# Altium footprint library PIF_PCB_Lib.PcbLib: 108 footprints (part 6 of 7)
Each footprint in its own frame and in the unit in brackets; x right, y up, seen from the top. Pads: shape width x height; smd on the part's side, far side on the other; paste and mask are expansions set on the pad; w line width, h text height; cw(c..) or ccw(c..) is an arc to the next point about the centre after c.
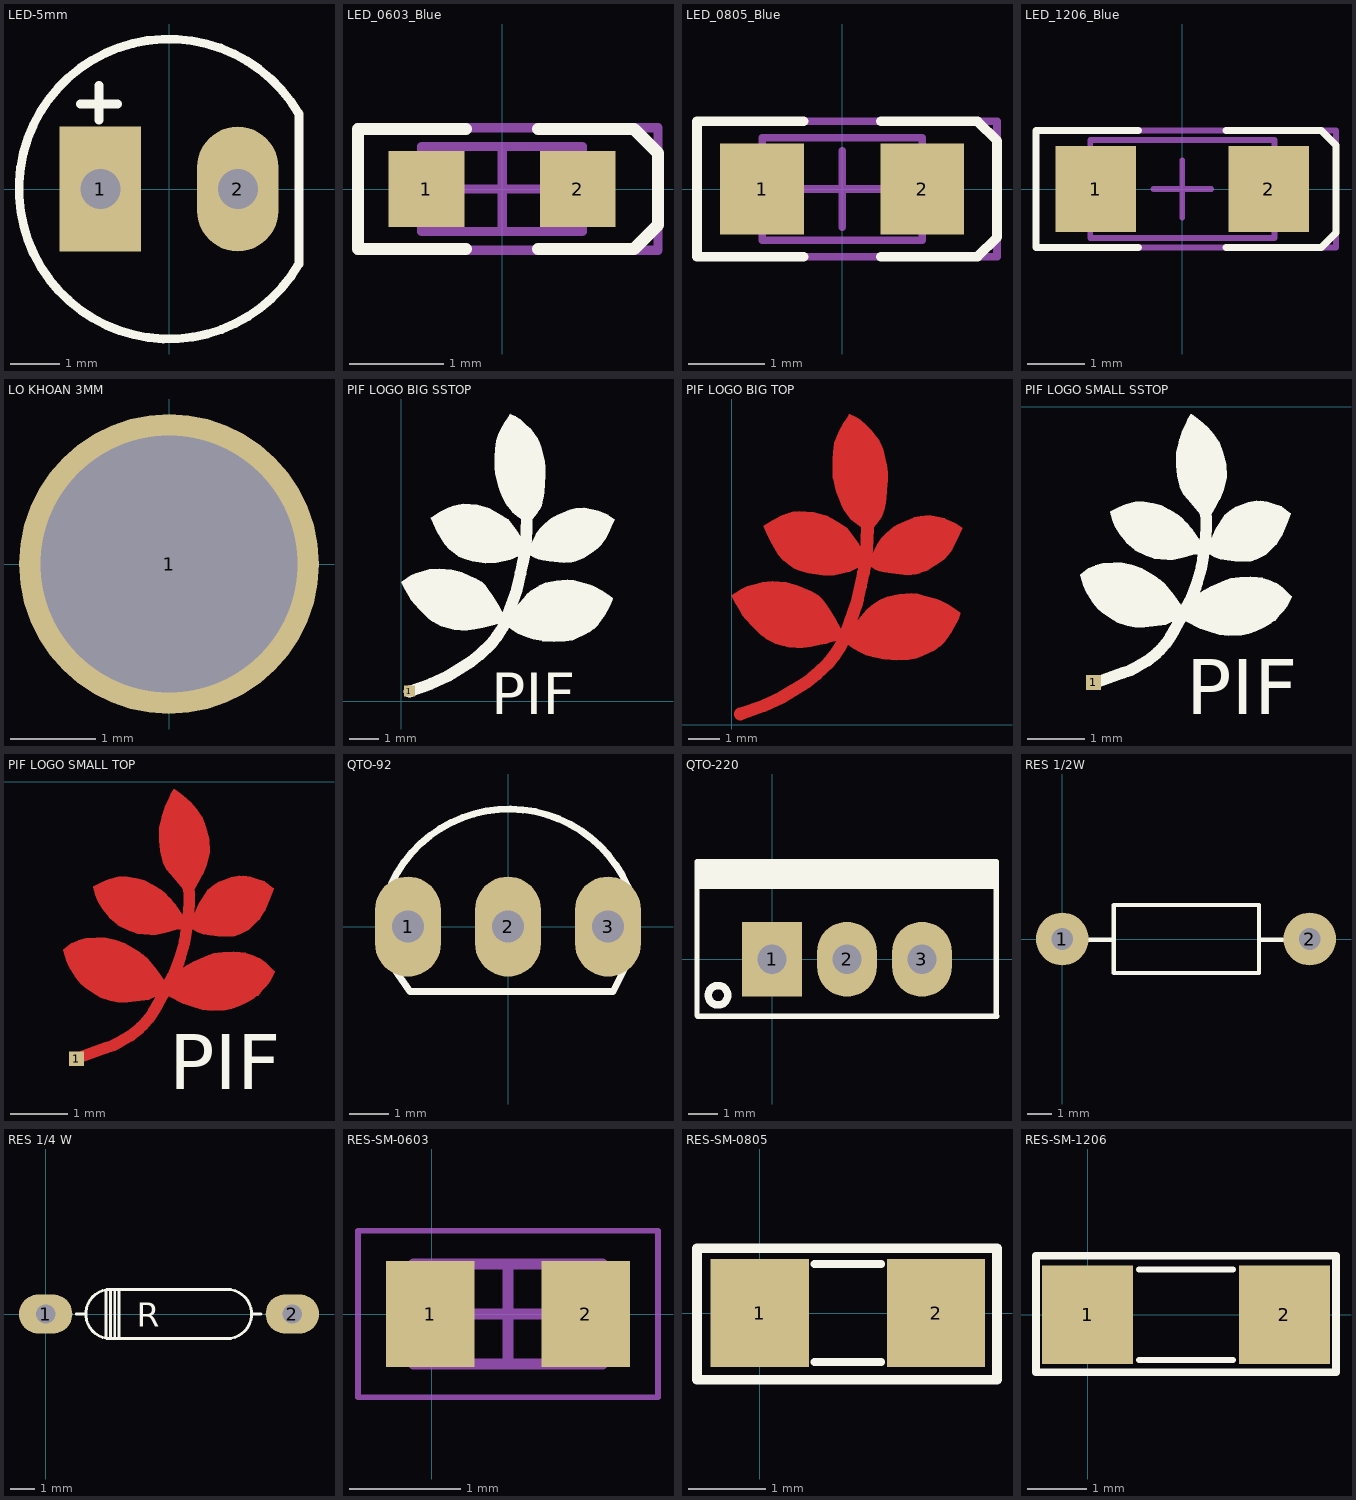
[diagram p5: the footprints below, top view; thin cyan lines are the x and y axes]

## LED-5mm [mil] "LED 2 PIN, 5 ly , Only colour, pin to pin 110mil"
height 300
pads (2):
  rect 65x100 hole 32: 1(-55,0)
  oval 65x100 hole 32: 2(55,0)
Top Overlay:
  lines w7: -71,68 -41,68 ; -56,55 -56,83 ; 103.51,60.71 ccw(c0,0) 103.94,-59.97 ; 104,-59 104,60
3D body "User Library-LEDd5B.STEP": height 339.18, standoff -243.49, extent -113.31,-120.49 100.08,116.5

## LED_0603_Blue [mm] "Chip LED, 2-Leads, Body 1.6x0.8mm, IPC Medium Density"
height 0.68
pads (2):
  rect 0.8x0.8 smd: 1(-0.8,0) 2(0.8,0)
Top Overlay:
  lines w0.127: -0.381,-0.635 -1.524,-0.635 -1.524,0.635 -0.381,0.635 ; 0.381,-0.635 1.397,-0.635 1.651,-0.381 1.651,0.381 1.397,0.635 0.381,0.635
Mechanical 13:
  lines w0.1: -0.85,-0.45 0.85,-0.45 0.85,0.45 -0.85,0.45 -0.85,-0.45
Mechanical 15:
  lines w0.1: -0.45,0 0.45,0 ; 0,-0.45 0,0.45 ; -1.525,-0.65 1.651,-0.65 1.651,0.65 -1.525,0.65 -1.525,-0.65
3D body "WL-SMCW_0603_LED.stp": height 0.7, standoff 0, extent -0.8,-0.4 0.8,0.4

## LED_0805_Blue [mm] "Chip LED, 2-Leads, Body 2.0x1.3mm, IPC Medium Density"
height 0.8
pads (2):
  rect 1.1x1.2 smd: 1(-1.05,0) 2(1.05,0)
Top Overlay:
  lines w0.127: -0.508,-0.889 -1.905,-0.889 -1.905,0.889 -0.508,0.889 ; 0.508,-0.889 1.778,-0.889 2.032,-0.635 2.032,0.635 1.778,0.889 0.508,0.889
Mechanical 13:
  lines w0.1: -1.05,-0.675 1.05,-0.675 1.05,0.675 -1.05,0.675 -1.05,-0.675
Mechanical 15:
  lines w0.1: -0.5,0 0.5,0 ; 0,-0.5 0,0.5 ; -1.905,-0.889 2.032,-0.889 2.032,0.889 -1.905,0.889 -1.905,-0.889
3D body "WL-SMCW_0805_LED.stp": height 0.68, standoff -0.02, extent -1,-0.625 1,0.625

## LED_1206_Blue [mm] "Chip LED, 2-Leads, Body 3.2x1.6mm, IPC Medium Density"
height 0.69
pads (2):
  rect 1.4x1.5 smd: 1(-1.5,0) 2(1.5,0)
Top Overlay:
  lines w0.127: -0.762,-1.016 -2.54,-1.016 -2.54,1.016 -0.762,1.016 ; 0.762,-1.016 2.413,-1.016 2.667,-0.762 2.667,0.762 2.413,1.016 0.762,1.016
Mechanical 13:
  lines w0.1: -1.6,-0.85 1.6,-0.85 1.6,0.85 -1.6,0.85 -1.6,-0.85
Mechanical 15:
  lines w0.1: -0.5,0 0.5,0 ; 0,-0.5 0,0.5 ; -2.54,-1.016 2.667,-1.016 2.667,1.016 -2.54,1.016 -2.54,-1.016
3D body "WL-SMCW_1206_LED.stp": height 0.68, standoff 0, extent -1.6,-0.8 1.6,0.8

## LO KHOAN 3MM [mil]
pads (1):
  round 138 hole 118.1: 1(0,0)

## PIF LOGO BIG SSTOP [mil]
pads (1):
  rect 15x15 smd: 1(11,14)
Top Overlay:
  drawing of 22 lines, arcs and shapes, not listed
  text "PIF" at 121.67,-17 h56.25

## PIF LOGO BIG TOP [mil]
Top Layer:
  region: 225.34,164.82 225.4,164.84 233.33,164 233.38,163.98 233.44,163.98 240.93,161.92 255.92,158.15 255.96,158.13 256.01,158.13 261.01,156.06 261.03,156.04 261.06,156.03 272.3,150.2 272.32,150.17 272.36,150.17 282.36,143.5 282.37,143.47 282.4,143.47 286.57,140.13 286.64,140 286.75,139.89 286.75,139.79 286.8,139.7 286.76,139.56 286.76,139.4 283.86,131.9 283.84,131.87 283.83,131.84 279.23,123.07 279.23,123.06 275.9,116.83 275.87,116.81 275.86,116.77 267.12,104.27 267.08,104.23 267.05,104.18 261.22,98.35 261.16,98.32 261.13,98.27 254.46,93.67 254.42,93.66 254.39,93.63 247.72,90.29 247.71,90.29 238.11,85.72 238.09,85.72 238.09,85.71 232.25,83.21 232.17,83.21 232.11,83.17 222.11,81.5 222.06,81.51 222.02,81.49 207.02,81.06 206.99,81.07 206.97,81.06 191.13,81.89 191.09,81.92 191.04,81.91 178.97,84.41 178.95,84.42 178.92,84.42 168.92,87.35 168.88,87.38 168.83,87.38 158.83,91.95 158.81,91.98 158.77,91.99 151.27,96.59 151.24,96.62 151.21,96.63 145.78,100.79 145.75,100.83 145.71,100.85 145.68,100.94 145.6,101.01 145.59,101.12 145.53,101.22 145.54,101.26 145.53,101.3 145.56,101.39 145.56,101.49 153.49,126.49 153.63,126.66 153.74,126.83 156.17,128.45 165.28,139.21 169.44,144.21 169.49,144.24 169.51,144.28 175.75,149.68 175.79,149.7 175.82,149.74 186.26,156.41 186.3,156.41 186.32,156.44 195.06,160.61 195.14,160.62 195.21,160.66 210.21,163.6 210.25,163.59 210.28,163.6 225.28,164.84
  region: 247.66,262.28 247.74,262.3 257.74,260.63 257.76,260.62 257.78,260.62 266.94,258.52 266.99,258.49 267.06,258.49 273.72,255.59 280.39,252.65 280.44,252.61 280.5,252.59 288.83,246.76 288.94,246.59 289.07,246.44 289.07,246.39 289.1,246.34 289.05,246.15 289.04,245.95 287.38,242.64 284.89,236.43 284.88,236.41 284.87,236.38 281.14,228.88 276.54,219.71 276.49,219.67 276.47,219.6 271.47,213.33 271.46,213.33 271.45,213.32 266.45,207.48 266.39,207.45 266.35,207.38 258.45,201.55 258.43,201.55 258.41,201.53 246.75,194.03 246.68,194.02 246.62,193.97 236.62,190.23 236.6,190.23 236.59,190.22 231.15,188.55 231.08,188.56 231.02,188.53 220.62,187.69 220.56,187.71 220.5,187.7 200.9,189.76 200.89,189.77 200.87,189.77 192.14,191.03 192.11,191.05 192.07,191.05 185.8,192.71 185.79,192.73 185.76,192.73 180.76,194.39 180.71,194.44 180.64,194.45 173.57,198.62 173.52,198.68 173.45,198.71 173.43,198.76 173.38,198.79 173.35,198.91 173.28,199.01 173.29,199.09 173.26,199.17 173.28,199.22 173.27,199.27 175.33,212.17 175.39,212.26 175.4,212.36 182.5,226.13 182.53,226.15 182.53,226.19 187.53,233.69 187.59,233.73 187.61,233.79 194.61,240.79 194.65,240.8 194.66,240.83 203.5,248 203.53,248.01 203.54,248.03 204.53,248.7 204.54,248.7 204.55,248.71 206.58,249.95 206.6,249.95 206.61,249.97 208.7,251.11 208.71,251.11 208.72,251.12 210.86,252.17 210.88,252.17 210.89,252.18 211.97,252.65 219.03,255.98 219.04,255.98 219.06,255.99 228.22,259.76 228.28,259.76 228.34,259.79 236.27,261.46 236.31,261.45 236.35,261.47 247.59,262.31
  region: 51.34,179.76 51.38,179.77 68.45,178.51 68.51,178.48 68.57,178.48 81.91,174.75 81.94,174.72 81.98,174.72 99.91,167.22 99.94,167.19 99.98,167.19 108.72,162.19 108.76,162.13 108.83,162.1 113.83,157.5 113.86,157.44 113.92,157.41 118.09,151.57 118.09,151.56 118.1,151.56 123.1,144.06 123.1,144.05 131.44,131.15 131.44,131.11 131.47,131.09 133.97,126.09 136.91,120.25 136.92,120.1 136.97,119.97 136.97,118.3 136.93,118.19 136.93,118.06 132.03,105.73 131.99,105.69 131.98,105.63 131.92,105.59 131.89,105.51 131.77,105.47 131.69,105.38 131.63,105.38 131.58,105.34 124,103.52 118.59,101.85 118.56,101.86 118.53,101.84 110.63,100.17 110.62,100.17 99.79,98.07 99.78,98.07 90.18,96.4 90.12,96.42 90.07,96.39 80.9,96.39 80.87,96.4 80.84,96.4 71.68,97.23 71.63,97.25 71.59,97.24 64.52,98.91 64.5,98.92 64.49,98.92 54.49,101.85 54.43,101.9 54.36,101.91 43.09,108.14 43.08,108.16 43.05,108.16 37.22,111.93 37.18,111.99 37.11,112.02 25.44,124.09 25.43,124.09 18.37,131.59 18.36,131.61 18.34,131.62 13.74,137.05 13.72,137.12 13.67,137.16 10.34,143.39 3.68,155.05 3.68,155.06 3.67,155.07 0.33,161.33 0.31,161.54 0.27,161.75 0.29,161.78 0.29,161.82 0.42,161.99 0.54,162.16 12.21,170.06 12.27,170.08 12.31,170.12 19.81,173.45 19.85,173.45 19.88,173.48 29.48,176.41 29.49,176.41 29.49,176.42 38.22,178.92 38.29,178.91 38.36,178.94 51.29,179.77
  region: 147.8,389.42 148.04,389.41 155.11,386.08 155.14,386.05 155.18,386.04 161.01,382.27 161.04,382.23 161.09,382.21 169.03,375.14 169.04,375.13 175.27,369.3 175.29,369.25 175.34,369.22 181.61,360.88 181.62,360.88 184.95,356.28 184.97,356.21 185.02,356.16 187.92,349.49 187.92,349.48 190.02,344.48 190.02,344.42 190.06,344.37 192.56,333.14 192.56,333.13 194.23,325.2 194.22,325.18 194.23,325.16 195.47,316.42 195.46,316.38 195.47,316.33 195.47,307.17 195.47,307.15 195.47,307.13 194.64,294.19 194.64,294.18 193.81,283.35 193.79,283.32 193.8,283.29 192.96,278.29 192.96,278.28 191.3,269.55 191.28,269.52 191.28,269.48 190.25,266.05 190.22,266.02 190.22,265.98 187.42,259.58 187.37,259.53 187.36,259.47 183.76,254.27 183.73,254.25 183.72,254.21 178.12,247.81 178.05,247.78 178.02,247.72 176.68,246.72 176.74,243.41 176.71,243.32 176.72,243.23 176.62,243.1 176.56,242.96 176.47,242.92 176.41,242.84 176.26,242.82 176.11,242.76 176.02,242.79 175.93,242.78 165.49,245.72 165.42,245.77 165.33,245.79 159.93,249.12 159.91,249.15 159.87,249.16 150.27,256.66 150.23,256.73 150.16,256.78 141.83,267.61 141.81,267.66 141.77,267.69 138.04,274.35 138.04,274.4 138,274.44 134.23,284.44 131.34,291.94 131.34,291.98 131.31,292.01 129.21,300.34 129.21,300.35 127.15,308.68 127.15,308.74 127.13,308.8 126.69,316.3 126.7,316.31 126.69,316.33 126.69,332.17 126.7,332.19 126.7,332.22 127.53,341.79 127.53,341.8 128.8,353.07 128.84,353.14 128.83,353.22 131.73,361.12 131.74,361.13 134.67,368.63 134.71,368.68 134.72,368.73 140.55,378.33 140.57,378.34 140.57,378.36 145.11,384.99 147.19,389.12 147.37,389.28 147.55,389.44 147.56,389.44 147.57,389.44
  region: 103.01,266.37 103.07,266.34 103.14,266.35 112.3,263.85 112.31,263.84 112.33,263.84 118.99,261.74 119.04,261.71 119.1,261.7 126.2,257.97 126.27,257.89 132.43,254.63 132.45,254.61 132.48,254.6 144.58,246.67 144.65,246.58 144.74,246.53 156.41,231.53 156.42,231.49 156.45,231.47 164.35,218.57 164.35,218.56 166.85,214.4 166.88,214.18 166.93,213.97 164.87,200.2 164.83,200.15 164.84,200.08 164.74,199.98 164.69,199.85 164.64,199.83 164.61,199.78 164.55,199.77 164.51,199.72 147.84,191.82 147.77,191.82 147.71,191.77 128.94,187.61 128.88,187.62 128.82,187.59 114.25,187.16 114.2,187.18 114.14,187.17 96.64,189.67 96.6,189.69 96.55,189.69 85.29,193.02 85.26,193.04 85.22,193.04 78.15,195.98 78.1,196.03 78.02,196.05 73.02,199.79 73.01,199.79 73,199.8 65.07,206.06 65.05,206.11 65,206.13 58.77,212.8 58.74,212.87 58.68,212.91 48.25,230.81 48.24,230.84 48.22,230.86 43.22,241.29 43.22,241.31 43.21,241.32 40.31,248.39 40.31,248.58 40.27,248.76 40.31,248.82 40.31,248.88 40.44,249.01 40.55,249.17 51.38,256.27 51.42,256.28 51.44,256.3 63.51,262.54 63.56,262.54 63.6,262.57 71.1,265.07 71.11,265.07 71.12,265.08 76.96,266.75 77.01,266.74 77.06,266.77 84.56,267.6 84.62,267.59 84.68,267.61
  lines w15.75: 11.17,13.57 40.2,23.9 62.5,34.07 95,54.07 106.67,63.63 122.07,78.23 129.17,87.4 137.07,99.07 144.17,116.13 156.67,151.57 157.9,156.97 161.67,173.63 165.4,190.73 167.67,200.73 168.5,211.17 169.33,221.57 169.77,230.73 171,264.83
  text "PIF" at 121.67,-17 h56.25

## PIF LOGO SMALL SSTOP [mil]
pads (1):
  rect 10x10 smd: 1(-190,-188)
Top Overlay:
  drawing of 50 lines, arcs and shapes, not listed
  text "PIF" at -126.57,-209.53 h37.5

## PIF LOGO SMALL TOP [mil]
pads (1):
  rect 10x10 smd: 1(-190,-189)
Top Layer:
  region: -170.52,-106.31 -170.47,-106.3 -163.83,-107.57 -163.79,-107.6 -163.74,-107.59 -157.07,-110.13 -157.04,-110.16 -156.99,-110.17 -151.3,-113.63 -147.84,-115.53 -147.82,-115.55 -147.79,-115.56 -144.62,-117.79 -144.6,-117.82 -144.57,-117.83 -141.41,-120.66 -141.39,-120.7 -141.35,-120.72 -135.32,-128.02 -135.31,-128.04 -135.29,-128.05 -129.59,-135.95 -129.57,-136.04 -129.51,-136.12 -129.52,-136.19 -129.49,-136.27 -129.51,-136.31 -129.5,-136.35 -129.55,-136.43 -129.56,-136.53 -132.97,-142.69 -132.67,-144.41 -132.7,-144.55 -132.69,-144.69 -132.74,-144.74 -132.76,-144.81 -132.88,-144.89 -132.97,-144.99 -140.57,-148.49 -140.66,-148.49 -140.73,-148.54 -155,-150.44 -155.03,-150.43 -155.07,-150.44 -161.7,-150.44 -161.75,-150.42 -161.8,-150.43 -166.87,-149.46 -166.9,-149.44 -166.94,-149.44 -173.28,-147.24 -173.32,-147.21 -173.37,-147.2 -177.8,-144.67 -177.82,-144.65 -177.84,-144.64 -184.18,-140.21 -184.19,-140.18 -184.23,-140.17 -187.09,-137.64 -187.11,-137.6 -187.15,-137.57 -189.99,-134.07 -189.99,-134.05 -190.02,-134.03 -192.55,-130.23 -192.55,-130.21 -192.57,-130.2 -195.1,-125.77 -195.11,-125.74 -195.12,-125.73 -197.02,-121.63 -197.03,-121.58 -197.05,-121.55 -198.95,-114.88 -198.94,-114.78 -198.97,-114.68 -198.92,-114.58 -198.91,-114.47 -198.82,-114.4 -198.77,-114.31 -193.71,-110.21 -193.63,-110.19 -193.57,-110.13 -188.83,-108.23 -188.81,-108.23 -188.8,-108.22 -183.73,-106.62 -183.65,-106.62 -183.57,-106.59 -183.24,-106.59 -176.62,-106.29 -176.61,-106.3 -176.6,-106.29 -170.57,-106.29
  region: -155.42,-64.71 -155.38,-64.7 -149.38,-65.67 -149.35,-65.68 -149.32,-65.68 -143.92,-67.25 -143.88,-67.28 -143.82,-67.28 -138.12,-70.15 -138.1,-70.17 -138.08,-70.18 -131.98,-74.08 -131.96,-74.1 -131.94,-74.1 -129.07,-76.3 -129.04,-76.36 -128.98,-76.4 -127.74,-77.95 -125.89,-79.48 -125.85,-79.55 -125.79,-79.59 -124.24,-81.8 -122.36,-83.98 -122.34,-84.02 -122.31,-84.04 -120.72,-86.57 -118.52,-89.72 -118.52,-89.74 -118.5,-89.75 -116.6,-92.92 -116.58,-93.07 -116.53,-93.2 -116.54,-93.23 -116.53,-93.26 -117.16,-98.96 -117.18,-98.99 -117.17,-99.02 -117.28,-99.17 -117.36,-99.32 -117.4,-99.33 -117.42,-99.36 -118.98,-100.33 -119.1,-100.35 -119.19,-100.4 -121.39,-100.7 -126.71,-102.29 -126.73,-102.28 -126.75,-102.29 -130.88,-103.23 -130.89,-103.23 -135.62,-104.2 -135.68,-104.19 -135.73,-104.21 -139.53,-104.21 -139.55,-104.2 -139.58,-104.21 -148.88,-103.47 -148.95,-103.44 -149.02,-103.44 -154.09,-101.54 -154.11,-101.52 -154.14,-101.52 -161.74,-97.72 -161.79,-97.66 -161.86,-97.64 -167.56,-92.57 -167.58,-92.52 -167.63,-92.5 -172.06,-86.8 -172.07,-86.77 -172.09,-86.76 -174.92,-82.32 -174.93,-82.28 -174.97,-82.24 -177.2,-76.84 -177.2,-76.8 -177.22,-76.77 -178.49,-72.04 -178.47,-71.89 -178.48,-71.73 -178.44,-71.69 -178.44,-71.63 -178.37,-71.58 -178.38,-71.49 -178.36,-71.47 -178.36,-71.45 -178.23,-71.32 -178.11,-71.18 -174.94,-69.61 -172.81,-68.55 -172.8,-68.55 -172.79,-68.54 -168.06,-66.34 -168.01,-66.34 -167.97,-66.31 -161.63,-64.71 -161.56,-64.72 -161.5,-64.69 -155.47,-64.69
  region: -123.07,-4.91 -122.89,-4.93 -122.87,-4.96 -122.84,-4.97 -118.74,-8.14 -118.72,-8.16 -118.7,-8.17 -115.22,-11.32 -112.06,-13.84 -112.04,-13.89 -111.99,-13.91 -107.89,-18.65 -107.88,-18.68 -107.85,-18.69 -104.35,-23.76 -104.34,-23.83 -104.29,-23.87 -101.76,-30.54 -101.76,-30.57 -101.74,-30.6 -99.54,-39.13 -99.55,-39.19 -99.53,-39.25 -99.19,-47.81 -99.22,-47.88 -99.2,-47.95 -101.11,-56.48 -101.14,-56.53 -101.14,-56.58 -104,-63.25 -104.02,-63.26 -104.02,-63.29 -107.19,-69.29 -107.2,-69.3 -107.2,-69.31 -110.03,-74.08 -110.08,-74.11 -110.1,-74.16 -112.97,-77.33 -112.98,-77.34 -112.98,-77.35 -113.01,-77.36 -113.02,-77.38 -113.18,-77.43 -113.34,-77.51 -113.35,-77.5 -113.37,-77.51 -113.39,-77.5 -113.41,-77.51 -113.57,-77.43 -113.73,-77.37 -113.74,-77.35 -113.75,-77.35 -113.76,-77.33 -113.78,-77.31 -125.48,-63.38 -128.65,-59.58 -128.67,-59.51 -128.73,-59.45 -130.96,-54.38 -130.96,-54.34 -130.99,-54.3 -132.89,-47 -132.88,-46.96 -132.91,-46.92 -133.54,-40.28 -133.53,-40.26 -133.54,-40.23 -133.54,-31 -133.51,-30.94 -133.52,-30.87 -131.29,-22.03 -131.28,-22.02 -131.28,-22 -129.38,-16.3 -129.35,-16.27 -129.35,-16.23 -127.16,-11.8 -125.89,-8.98 -125.87,-8.96 -125.87,-8.93 -123.63,-5.13 -123.6,-5.1 -123.59,-5.07 -123.44,-4.98 -123.3,-4.88 -123.27,-4.88 -123.24,-4.86
  region: -82.86,-115.8 -82.83,-115.79 -78.4,-116.09 -78.37,-116.11 -78.34,-116.1 -74.54,-116.73 -74.51,-116.76 -74.46,-116.75 -70.66,-118.02 -70.64,-118.04 -70.62,-118.04 -68.39,-119 -65.23,-120.26 -65.18,-120.32 -65.1,-120.34 -61,-123.5 -60.99,-123.53 -60.96,-123.54 -54.93,-129.24 -54.88,-129.35 -54.79,-129.45 -54.8,-129.54 -54.76,-129.62 -54.8,-129.73 -54.81,-129.86 -56.41,-133.33 -56.42,-133.34 -56.43,-133.36 -57.99,-136.23 -58.03,-136.26 -58.04,-136.3 -60.58,-139.47 -60.59,-139.48 -60.6,-139.49 -63.12,-142.32 -65.98,-145.81 -66.14,-145.9 -66.3,-146 -67.3,-146.19 -68.55,-147.42 -68.62,-147.45 -68.66,-147.5 -74.02,-150.67 -74.06,-150.67 -74.08,-150.7 -79.15,-152.93 -79.16,-152.93 -79.17,-152.94 -83.93,-154.84 -83.99,-154.84 -84.03,-154.86 -88.76,-155.8 -88.81,-155.79 -88.85,-155.81 -97.71,-156.14 -97.75,-156.13 -97.79,-156.14 -104.12,-155.51 -104.17,-155.48 -104.22,-155.49 -110.56,-153.59 -110.57,-153.58 -110.58,-153.58 -116.91,-151.34 -116.94,-151.32 -116.98,-151.32 -127.11,-146.25 -127.17,-146.18 -127.25,-146.15 -127.29,-146.05 -127.37,-145.97 -127.37,-145.95 -127.38,-145.94 -127.37,-145.85 -127.41,-145.77 -127.37,-145.67 -127.37,-145.56 -123.57,-136.39 -123.49,-136.32 -123.45,-136.22 -120.81,-133.55 -121.07,-131.92 -121.06,-131.9 -121.07,-131.88 -121.02,-131.7 -120.97,-131.51 -120.95,-131.51 -120.95,-131.49 -118.98,-129.13 -119,-129.14 -119.19,-129.16 -119.38,-129.2 -119.39,-129.19 -119.41,-129.19 -119.56,-129.07 -119.72,-128.96 -119.72,-128.94 -119.74,-128.94 -119.76,-128.74 -119.8,-128.55 -119.79,-128.54 -119.79,-128.52 -119.67,-128.37 -119.56,-128.21 -114.19,-124.75 -114.02,-124.71 -113.85,-124.66 -113.82,-124.68 -113.79,-124.67 -113.64,-124.77 -113.63,-124.78 -110.38,-122.84 -110.35,-122.83 -110.33,-122.81 -105.56,-120.58 -105.55,-120.58 -105.54,-120.57 -100.17,-118.37 -100.15,-118.37 -100.14,-118.35 -96.34,-117.09 -96.29,-117.09 -96.25,-117.07 -90.22,-116.1 -90.19,-116.11 -90.16,-116.09 -82.89,-115.79
  region: -82.86,-115.8 -82.83,-115.79 -78.4,-116.09 -78.37,-116.11 -78.34,-116.1 -74.54,-116.73 -74.51,-116.76 -74.46,-116.75 -70.66,-118.02 -70.64,-118.04 -70.62,-118.04 -68.39,-119 -65.23,-120.26 -65.18,-120.32 -65.1,-120.34 -61,-123.5 -60.99,-123.53 -60.96,-123.54 -54.93,-129.24 -54.88,-129.35 -54.79,-129.45 -54.8,-129.54 -54.76,-129.62 -54.8,-129.73 -54.81,-129.86 -56.41,-133.33 -56.42,-133.34 -56.43,-133.36 -57.99,-136.23 -58.03,-136.26 -58.04,-136.3 -60.58,-139.47 -60.59,-139.48 -60.6,-139.49 -63.12,-142.32 -65.98,-145.81 -66.14,-145.9 -66.3,-146 -67.3,-146.19 -68.55,-147.42 -68.62,-147.45 -68.66,-147.5 -74.02,-150.67 -74.06,-150.67 -74.08,-150.7 -79.15,-152.93 -79.16,-152.93 -79.17,-152.94 -83.93,-154.84 -83.99,-154.84 -84.03,-154.86 -88.76,-155.8 -88.81,-155.79 -88.85,-155.81 -97.71,-156.14 -97.75,-156.13 -97.79,-156.14 -104.12,-155.51 -104.17,-155.48 -104.22,-155.49 -110.56,-153.59 -110.57,-153.58 -110.58,-153.58 -116.91,-151.34 -116.94,-151.32 -116.98,-151.32 -127.11,-146.25 -127.17,-146.18 -127.25,-146.15 -127.29,-146.05 -127.37,-145.97 -127.37,-145.95 -127.38,-145.94 -127.37,-145.85 -127.41,-145.77 -127.37,-145.67 -127.37,-145.56 -123.57,-136.39 -123.49,-136.32 -123.45,-136.22 -120.81,-133.55 -121.07,-131.92 -121.06,-131.9 -121.07,-131.88 -121.02,-131.7 -120.97,-131.51 -120.95,-131.51 -120.95,-131.49 -118.98,-129.13 -119,-129.14 -119.19,-129.16 -119.38,-129.2 -119.39,-129.19 -119.41,-129.19 -119.56,-129.07 -119.72,-128.96 -119.72,-128.94 -119.74,-128.94 -119.76,-128.74 -119.8,-128.55 -119.79,-128.54 -119.79,-128.52 -119.67,-128.37 -119.56,-128.21 -114.19,-124.75 -114.02,-124.71 -113.85,-124.66 -113.82,-124.68 -113.79,-124.67 -113.64,-124.77 -113.63,-124.78 -110.38,-122.84 -110.35,-122.83 -110.33,-122.81 -105.56,-120.58 -105.55,-120.58 -105.54,-120.57 -100.17,-118.37 -100.15,-118.37 -100.14,-118.35 -96.34,-117.09 -96.29,-117.09 -96.25,-117.07 -90.22,-116.1 -90.19,-116.11 -90.16,-116.09 -82.89,-115.79
  region: -170.52,-106.31 -170.47,-106.3 -163.83,-107.57 -163.79,-107.6 -163.74,-107.59 -157.07,-110.13 -157.04,-110.16 -156.99,-110.17 -151.3,-113.63 -147.84,-115.53 -147.82,-115.55 -147.79,-115.56 -144.62,-117.79 -144.6,-117.82 -144.57,-117.83 -141.41,-120.66 -141.39,-120.7 -141.35,-120.72 -135.32,-128.02 -135.31,-128.04 -135.29,-128.05 -129.59,-135.95 -129.57,-136.04 -129.51,-136.12 -129.52,-136.19 -129.49,-136.27 -129.51,-136.31 -129.5,-136.35 -129.55,-136.43 -129.56,-136.53 -132.97,-142.69 -132.67,-144.41 -132.7,-144.55 -132.69,-144.69 -132.74,-144.74 -132.76,-144.81 -132.88,-144.89 -132.97,-144.99 -140.57,-148.49 -140.66,-148.49 -140.73,-148.54 -155,-150.44 -155.03,-150.43 -155.07,-150.44 -161.7,-150.44 -161.75,-150.42 -161.8,-150.43 -166.87,-149.46 -166.9,-149.44 -166.94,-149.44 -173.28,-147.24 -173.32,-147.21 -173.37,-147.2 -177.8,-144.67 -177.82,-144.65 -177.84,-144.64 -184.18,-140.21 -184.19,-140.18 -184.23,-140.17 -187.09,-137.64 -187.11,-137.6 -187.15,-137.57 -189.99,-134.07 -189.99,-134.05 -190.02,-134.03 -192.55,-130.23 -192.55,-130.21 -192.57,-130.2 -195.1,-125.77 -195.11,-125.74 -195.12,-125.73 -197.02,-121.63 -197.03,-121.58 -197.05,-121.55 -198.95,-114.88 -198.94,-114.78 -198.97,-114.68 -198.92,-114.58 -198.91,-114.47 -198.82,-114.4 -198.77,-114.31 -193.71,-110.21 -193.63,-110.19 -193.57,-110.13 -188.83,-108.23 -188.81,-108.23 -188.8,-108.22 -183.73,-106.62 -183.65,-106.62 -183.57,-106.59 -183.24,-106.59 -176.62,-106.29 -176.61,-106.3 -176.6,-106.29 -170.57,-106.29
  region: -155.42,-64.71 -155.38,-64.7 -149.38,-65.67 -149.35,-65.68 -149.32,-65.68 -143.92,-67.25 -143.88,-67.28 -143.82,-67.28 -138.12,-70.15 -138.1,-70.17 -138.08,-70.18 -131.98,-74.08 -131.96,-74.1 -131.94,-74.1 -129.07,-76.3 -129.04,-76.36 -128.98,-76.4 -127.74,-77.95 -125.89,-79.48 -125.85,-79.55 -125.79,-79.59 -124.24,-81.8 -122.36,-83.98 -122.34,-84.02 -122.31,-84.04 -120.72,-86.57 -118.52,-89.72 -118.52,-89.74 -118.5,-89.75 -116.6,-92.92 -116.58,-93.07 -116.53,-93.2 -116.54,-93.23 -116.53,-93.26 -117.16,-98.96 -117.18,-98.99 -117.17,-99.02 -117.28,-99.17 -117.36,-99.32 -117.4,-99.33 -117.42,-99.36 -118.98,-100.33 -119.1,-100.35 -119.19,-100.4 -121.39,-100.7 -126.71,-102.29 -126.73,-102.28 -126.75,-102.29 -130.88,-103.23 -130.89,-103.23 -135.62,-104.2 -135.68,-104.19 -135.73,-104.21 -139.53,-104.21 -139.55,-104.2 -139.58,-104.21 -148.88,-103.47 -148.95,-103.44 -149.02,-103.44 -154.09,-101.54 -154.11,-101.52 -154.14,-101.52 -161.74,-97.72 -161.79,-97.66 -161.86,-97.64 -167.56,-92.57 -167.58,-92.52 -167.63,-92.5 -172.06,-86.8 -172.07,-86.77 -172.09,-86.76 -174.92,-82.32 -174.93,-82.28 -174.97,-82.24 -177.2,-76.84 -177.2,-76.8 -177.22,-76.77 -178.49,-72.04 -178.47,-71.89 -178.48,-71.73 -178.44,-71.69 -178.44,-71.63 -178.37,-71.58 -178.38,-71.49 -178.36,-71.47 -178.36,-71.45 -178.23,-71.32 -178.11,-71.18 -174.94,-69.61 -172.81,-68.55 -172.8,-68.55 -172.79,-68.54 -168.06,-66.34 -168.01,-66.34 -167.97,-66.31 -161.63,-64.71 -161.56,-64.72 -161.5,-64.69 -155.47,-64.69
  region: -123.07,-4.91 -122.89,-4.93 -122.87,-4.96 -122.84,-4.97 -118.74,-8.14 -118.72,-8.16 -118.7,-8.17 -115.22,-11.32 -112.06,-13.84 -112.04,-13.89 -111.99,-13.91 -107.89,-18.65 -107.88,-18.68 -107.85,-18.69 -104.35,-23.76 -104.34,-23.83 -104.29,-23.87 -101.76,-30.54 -101.76,-30.57 -101.74,-30.6 -99.54,-39.13 -99.55,-39.19 -99.53,-39.25 -99.19,-47.81 -99.22,-47.88 -99.2,-47.95 -101.11,-56.48 -101.14,-56.53 -101.14,-56.58 -104,-63.25 -104.02,-63.26 -104.02,-63.29 -107.19,-69.29 -107.2,-69.3 -107.2,-69.31 -110.03,-74.08 -110.08,-74.11 -110.1,-74.16 -112.97,-77.33 -112.98,-77.34 -112.98,-77.35 -113.01,-77.36 -113.02,-77.38 -113.18,-77.43 -113.34,-77.51 -113.35,-77.5 -113.37,-77.51 -113.39,-77.5 -113.41,-77.51 -113.57,-77.43 -113.73,-77.37 -113.74,-77.35 -113.75,-77.35 -113.76,-77.33 -113.78,-77.31 -125.48,-63.38 -128.65,-59.58 -128.67,-59.51 -128.73,-59.45 -130.96,-54.38 -130.96,-54.34 -130.99,-54.3 -132.89,-47 -132.88,-46.96 -132.91,-46.92 -133.54,-40.28 -133.52,-40.23 -133.54,-40.18 -132.57,-29.42 -132.56,-29.4 -132.57,-29.37 -131.3,-22.07 -131.28,-22.04 -131.28,-22 -129.38,-16.3 -129.35,-16.27 -129.35,-16.23 -127.16,-11.8 -125.89,-8.98 -125.87,-8.96 -125.87,-8.93 -123.63,-5.13 -123.6,-5.1 -123.59,-5.07 -123.44,-4.98 -123.3,-4.88 -123.27,-4.88 -123.24,-4.86
  region: -76.29,-64.08 -76.23,-64.06 -71.49,-64.7 -71.45,-64.72 -71.4,-64.72 -66.34,-66.32 -66.33,-66.32 -61.56,-67.89 -61.49,-67.95 -61.4,-67.97 -55.7,-72.41 -55.64,-72.52 -55.55,-72.6 -55.54,-72.69 -55.5,-72.77 -55.53,-72.89 -55.52,-73.01 -57.42,-78.41 -57.44,-78.43 -57.44,-78.45 -60.94,-86.68 -60.96,-86.71 -60.97,-86.75 -62.87,-89.91 -62.87,-89.92 -65.41,-94.02 -65.46,-94.06 -65.49,-94.12 -72.46,-100.79 -72.53,-100.82 -72.58,-100.88 -78.58,-104.05 -78.63,-104.05 -78.66,-104.08 -82.46,-105.35 -82.55,-105.34 -82.63,-105.37 -93.4,-105.37 -93.43,-105.36 -93.46,-105.37 -98.86,-104.74 -98.87,-104.73 -98.88,-104.74 -103.31,-104.1 -103.37,-104.07 -103.44,-104.07 -107.24,-102.47 -107.26,-102.44 -107.29,-102.44 -110.76,-100.54 -110.81,-100.48 -110.88,-100.45 -110.93,-100.32 -111.02,-100.22 -111.01,-100.14 -111.04,-100.07 -111.04,-93.43 -111,-93.33 -111,-93.22 -106.56,-83.08 -106.53,-83.05 -106.52,-83.01 -100.82,-74.14 -100.75,-74.09 -100.71,-74.02 -97.24,-71.15 -97.21,-71.14 -97.19,-71.11 -92.76,-68.28 -92.7,-68.27 -92.66,-68.23 -84.43,-65.06 -84.37,-65.06 -84.33,-65.03 -78.93,-64.07 -78.75,-64.11 -78.56,-64.13 -78.55,-64.15 -78.52,-64.16 -78.44,-64.28 -76.36,-64.06
  region: -76.29,-64.08 -76.23,-64.06 -71.49,-64.7 -71.45,-64.72 -71.4,-64.72 -66.34,-66.32 -66.33,-66.32 -61.56,-67.89 -61.49,-67.95 -61.4,-67.97 -55.7,-72.41 -55.64,-72.52 -55.55,-72.6 -55.54,-72.69 -55.5,-72.77 -55.53,-72.89 -55.52,-73.01 -57.42,-78.41 -57.44,-78.43 -57.44,-78.45 -60.94,-86.68 -60.96,-86.71 -60.97,-86.75 -62.87,-89.91 -62.87,-89.92 -65.41,-94.02 -65.46,-94.06 -65.49,-94.12 -72.46,-100.79 -72.53,-100.82 -72.58,-100.88 -78.58,-104.05 -78.63,-104.05 -78.66,-104.08 -82.46,-105.35 -82.55,-105.34 -82.63,-105.37 -93.4,-105.37 -93.43,-105.36 -93.46,-105.37 -98.86,-104.74 -98.87,-104.73 -98.88,-104.74 -103.31,-104.1 -103.37,-104.07 -103.44,-104.07 -107.24,-102.47 -107.26,-102.44 -107.29,-102.44 -110.76,-100.54 -110.81,-100.48 -110.88,-100.45 -110.93,-100.32 -111.02,-100.22 -111.01,-100.14 -111.04,-100.07 -111.04,-93.43 -111,-93.33 -111,-93.22 -106.56,-83.08 -106.53,-83.05 -106.52,-83.01 -100.82,-74.14 -100.75,-74.09 -100.71,-74.02 -97.24,-71.15 -97.21,-71.14 -97.19,-71.11 -92.76,-68.28 -92.7,-68.27 -92.66,-68.23 -84.43,-65.06 -84.37,-65.06 -84.33,-65.03 -78.93,-64.07 -78.75,-64.11 -78.56,-64.13 -78.55,-64.15 -78.52,-64.16 -78.44,-64.28 -76.36,-64.06
  lines w7.87: -169.53,-181.33 -190.97,-189.03 -169.53,-181.33 ; -169.53,-181.33 -164.57,-179.7 ; -169.53,-181.33 -164.57,-179.7 ; -164.57,-179.7 -160.73,-177.5 ; -164.57,-179.7 -160.73,-177.5 ; -160.73,-177.5 -153.03,-173.1 ; -160.73,-177.5 -153.03,-173.1 ; -153.03,-173.1 -146.97,-168.13 ; -153.03,-173.1 -146.97,-168.13 ; -146.97,-168.13 -144.07,-165.43 ; -146.97,-168.13 -144.07,-165.43 ; -144.07,-165.43 -140.33,-161.17 ; -144.07,-165.43 -140.33,-161.17 ; -140.33,-161.17 -137.67,-157.17 ; -140.33,-161.17 -137.67,-157.17 ; -137.67,-157.17 -134.73,-152.1 ; -137.67,-157.17 -134.73,-152.1 ; -134.73,-152.1 -128.07,-139.57 ; -134.73,-152.1 -128.07,-139.57 ; -128.07,-139.57 -124.07,-132.1 ; -128.07,-139.57 -124.07,-132.1 ; -124.07,-132.1 -120.07,-122.5 ; -124.07,-132.1 -120.07,-122.5 ; -120.07,-122.5 -119.27,-119.83 ; -120.07,-122.5 -119.27,-119.83 ; -119.27,-119.83 -116.37,-109.67 ; -119.27,-119.83 -116.37,-109.67 ; -116.37,-109.67 -115.3,-104.07 ; -116.37,-109.67 -115.3,-104.07 ; -115.3,-104.07 -113.97,-94.73 ; -115.3,-104.07 -113.97,-94.73 ; -113.97,-94.73 -113.43,-88.33 ; -113.97,-94.73 -113.43,-88.33 ; -113.43,-88.33 -112.9,-82.47 ; -113.43,-88.33 -112.9,-82.47 ; -113.17,-75.53 -112.9,-82.47 ; -113.17,-75.53 -113.7,-72.07 -113.17,-75.53 ; -113.17,-75.53 -112.9,-82.47
Top Overlay:
  text "PIF" at -126.57,-209.53 h37.5

## QTO-92 [mil] "TO-92"
height 200
pads (3):
  oval 66x100 hole 32: 1(-100,0) 2(0,0) 3(100,0)
Top Overlay:
  lines w7: -116.52,43.21 cw(c0.97,-12.43) 119.94,39.97 ; -115.34,-40.24 -98,-65 105,-65 118,-39
3D body "SW3dPS-TO92.STEP": height 245.04, standoff -199.79, extent -108.87,-65.56 108.86,95

## QTO-220 [mil] "TO-220 - 1-2-3"
height 200
pads (3):
  rect 80x100 hole 39: 1(0,0)
  oval 80x100 hole 39: 2(100,0) 3(200,0)
Top Overlay:
  circle w10: c-72.03,-48 r12.97
  rectangle: -99,94 300,130
  lines w7: 298,107 299,93 ; -100,-75 -100,130 299,130 299,-75 300,-76 -76,-76 -99,-76 -100,-75
3D body "SW3dPS-TO220AB.STEP": height 754.72, standoff -400, extent -119,-64 322.46,120.65

## RES 1/2W [mil] "R 1/2W, 2 pin, 300mil"
height 100
pads (2):
  round 85 hole 35: 1(0,0) 2(400,0)
Top Overlay:
  lines w7: 42,-1 83,-1 ; 318,-1 356,-1 ; 83,-55 83,55 318,55 318,-55 83,-55
3D body "SW3dPS-AXIAL_RESISTOR(0.25W).STEP": height 91.42, standoff -70, extent -11.6,-45.49 413.6,49

## RES 1/4 W [mm]
pads (2):
  oval 2.2x1.6 hole 0.787: 1(0,0) 2(10.16,0)
Top Overlay:
  lines w0.12: 1.257,0 1.651,0 ; 2.489,-0.978 2.489,0.978 ; 2.591,1.016 7.468,1.016 cw(c7.468,0) 7.468,-1.016 2.667,-1.016 cw(c2.667,0) 2.667,1.016 ; 2.68,-1.016 2.667,-1.003 2.667,1.003 2.68,1.016 ; 2.845,-1.016 2.845,1.016 ; 3.023,-1.003 3.023,0.991 ; 8.484,0 8.877,0
  text "R" at 3.746,-0.521 h1
3D body "User Library-RESISTOR, 0_25 W, 0_4 IN LEAD PITCH.step": height 2.93, standoff -2.54, extent -0.305,-1.156 10.465,1.156

## RES-SM-0603 [mm]
pads (2):
  rect 0.8x0.95 smd: 1(-0.014,0) 2(1.386,0)
Mechanical 13:
  lines w0.1: -0.164,-0.45 1.536,-0.45 1.536,0.45 -0.164,0.45 -0.164,-0.45
Mechanical 15:
  lines w0.05: -0.664,-0.75 2.036,-0.75 2.036,0.75 -0.664,0.75 -0.664,-0.75
  lines w0.1: 0.236,0 1.136,0 ; 0.686,-0.45 0.686,0.45
3D body "User Library-0603 SMD Capacitor.step": height 0.3, standoff 0, extent -0.114,-0.4 1.486,0.4

## RES-SM-0805 [mil]
pads (2):
  rect 50x55 smd: 1(0,0) 2(90,0)
Top Overlay:
  lines w4: 28,-25 62,-25 ; 28,25 62,25
  lines w5: -32,-34 121,-34 121,33 -32,33 -32,-34
3D body "SW3dPS-0805 SMD Resistor.STEP": height 31.39, standoff 0.6, extent 5.64,-24.6 84.38,24.61

## RES-SM-1206 [mil]
pads (2):
  rect 60x65 smd: 1(0,0) 2(130,0)
Top Overlay:
  lines w4: 34,-30 96,-30 ; 34,30 96,30
  lines w5: -34,-38 -34,39 164,39 164,-38 -34,-38
3D body "1206 SMD Resistor.step": height 40.05, standoff 0.6, extent 2.01,-31.49 128,31.5